# Altium footprint library ICs And Semiconductors THD.PcbLib: 507 footprints (part 21 of 32)
Each footprint in its own frame and in the unit in brackets; x right, y up, seen from the top. Pads: shape width x height; smd on the part's side, far side on the other; paste and mask are expansions set on the pad; w line width, h text height; cw(c..) or ccw(c..) is an arc to the next point about the centre after c.
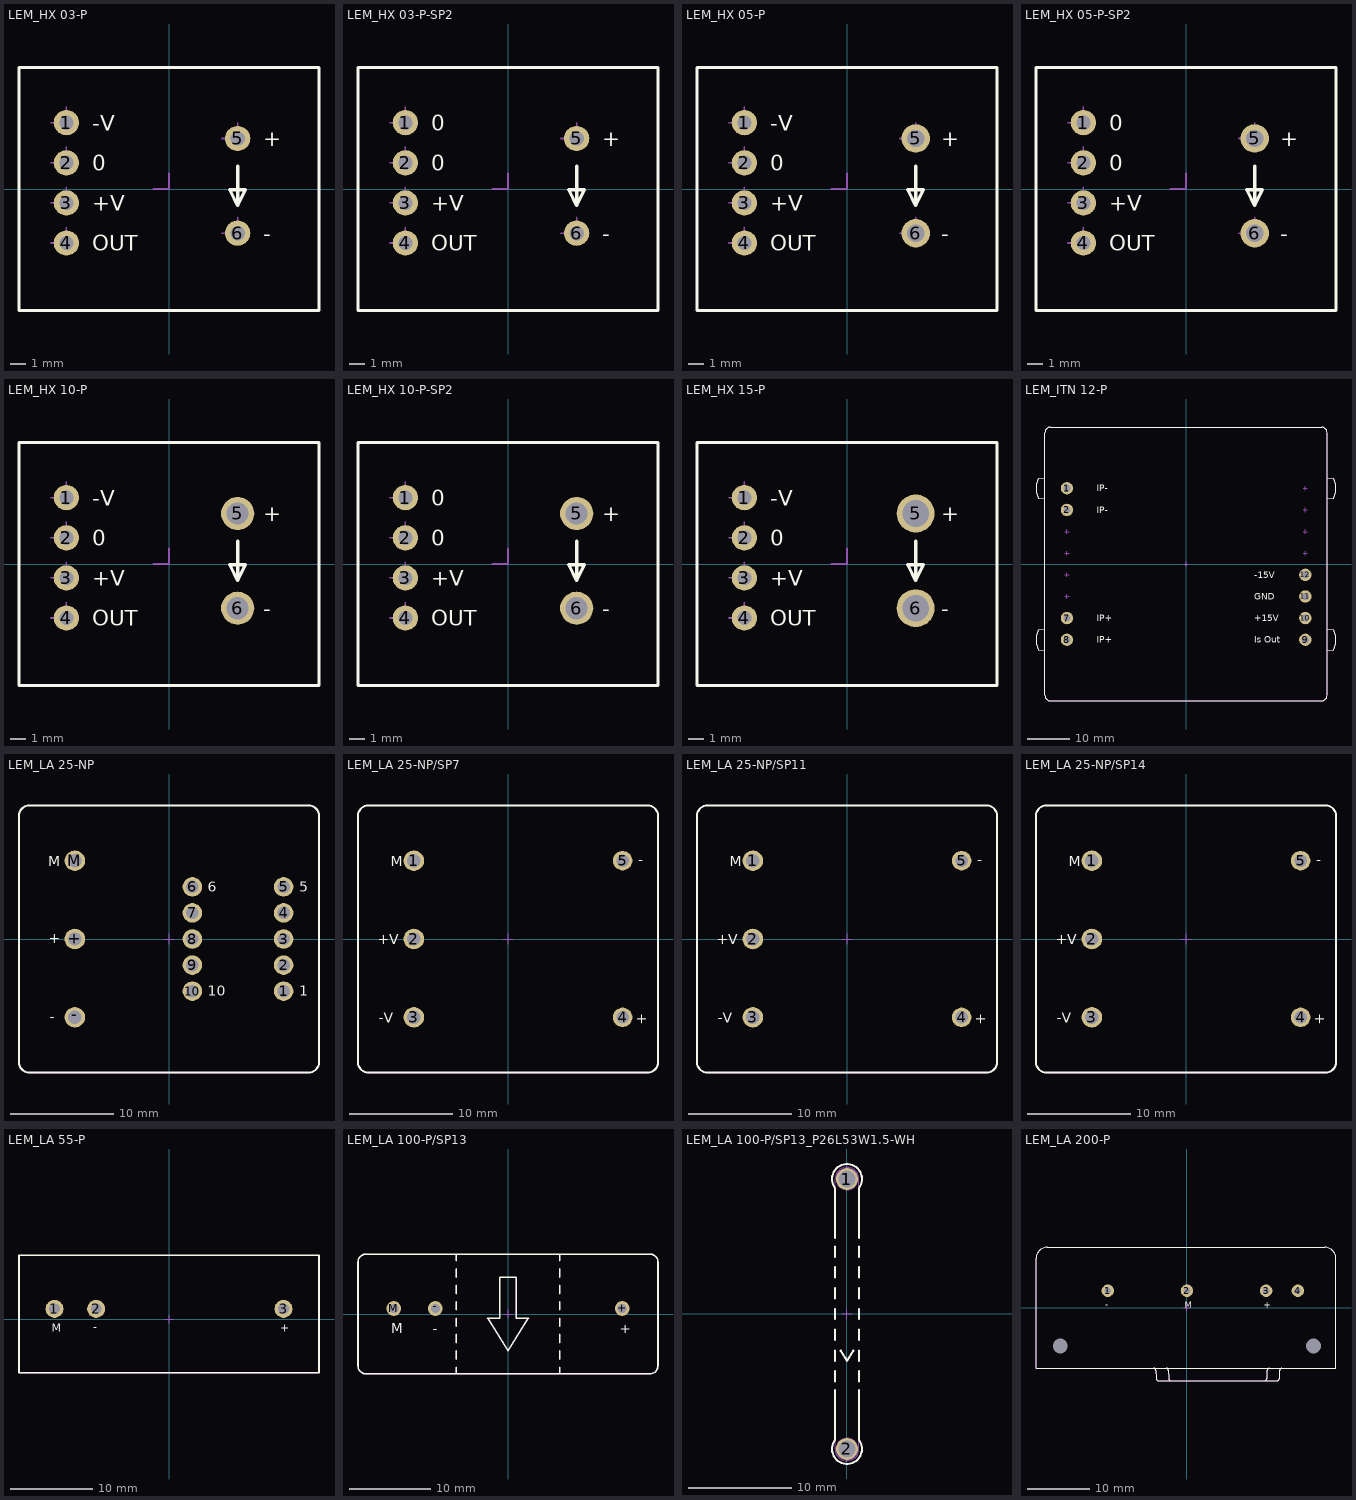
[diagram p20: the footprints below, top view; thin cyan lines are the x and y axes]

## LEM_HX 03-P [mm] "LEM Current Transducer, Body 19x15.4mm (max)"
height 20
pads (6):
  round 1.6 hole 0.9: 1(-6.5,4.2) 2(-6.5,1.66) 3(-6.5,-0.88) 4(-6.5,-3.42) 5(4.35,3.2) 6(4.35,-2.8)
Top Overlay:
  lines w0.2: 4.35,1.45 4.35,-1.05 ; 4.35,-1.05 4.85,-0.05 3.85,-0.05 4.35,-1.05 ; -9.5,-7.7 -9.5,7.7 9.5,7.7 9.5,-7.7 -9.5,-7.7
  text "-" at 5.985,-3.3 h1
  text "+" at 5.985,2.7 h1
  text "OUT" at -4.865,-3.92 h1
  text "+V" at -4.865,-1.38 h1
  text "0" at -4.865,1.16 h1
  text "-V" at -4.865,3.7 h1
Notvisible:
  circle w0.1: c4.35,-2.8 r0.3
  circle w0.1: c4.35,3.2 r0.3
  lines w0.1: -7.5,-3.42 -6.5,-3.42 -6.5,-2.42 ; -7.5,-0.88 -6.5,-0.88 -6.5,0.12 ; -7.5,1.66 -6.5,1.66 -6.5,2.66 ; -7.5,4.2 -6.5,4.2 -6.5,5.2 ; -1,0 0,0 0,1 ; 3.35,-2.8 4.35,-2.8 4.35,-1.8 ; 3.35,3.2 4.35,3.2 4.35,4.2 ; -6.625,-3.67 -6.625,-3.17 -6.375,-3.17 -6.375,-3.67 -6.625,-3.67 ; -6.625,-1.13 -6.625,-0.63 -6.375,-0.63 -6.375,-1.13 -6.625,-1.13 ; -6.625,1.41 -6.625,1.91 -6.375,1.91 -6.375,1.41 -6.625,1.41 ; -6.625,3.95 -6.625,4.45 -6.375,4.45 -6.375,3.95 -6.625,3.95
Mechanical 14:
  lines w0.1: 4.35,1.45 4.35,-1.05 ; 4.35,-1.05 3.85,-0.05 4.85,-0.05 4.35,-1.05 ; -9.5,-7.7 9.5,-7.7 9.5,7.7 -9.5,7.7 -9.5,-7.7
  text "-" at 5.985,-3.3 h1
  text "+" at 5.985,2.7 h1
  text "-V" at -4.865,3.7 h1
  text "0" at -4.865,1.16 h1
  text "+V" at -4.865,-1.38 h1
  text "OUT" at -4.865,-3.92 h1
3D body "LEM_HX 03-P.stp": height 20, standoff -4, extent -9.5,-7.7 9.5,7.7

## LEM_HX 03-P-SP2 [mm] "LEM Current Transducer, Body 19x15.4mm (max)"
height 20
pads (6):
  round 1.6 hole 0.9: 1(-6.5,4.2) 2(-6.5,1.66) 3(-6.5,-0.88) 4(-6.5,-3.42) 5(4.35,3.2) 6(4.35,-2.8)
Top Overlay:
  lines w0.2: 4.35,1.45 4.35,-1.05 ; 4.35,-1.05 3.85,-0.05 4.85,-0.05 4.35,-1.05 ; -9.5,-7.7 9.5,-7.7 9.5,7.7 -9.5,7.7 -9.5,-7.7
  text "0" at -4.865,3.7 h1
  text "0" at -4.865,1.16 h1
  text "+V" at -4.865,-1.38 h1
  text "OUT" at -4.865,-3.92 h1
  text "+" at 5.985,2.7 h1
  text "-" at 5.985,-3.3 h1
Notvisible:
  circle w0.1: c4.35,3.2 r0.3
  circle w0.1: c4.35,-2.8 r0.3
  lines w0.1: -7.5,-3.42 -6.5,-3.42 -6.5,-2.42 ; -7.5,-0.88 -6.5,-0.88 -6.5,0.12 ; -7.5,1.66 -6.5,1.66 -6.5,2.66 ; -7.5,4.2 -6.5,4.2 -6.5,5.2 ; -1,0 0,0 0,1 ; 3.35,-2.8 4.35,-2.8 4.35,-1.8 ; 3.35,3.2 4.35,3.2 4.35,4.2 ; -6.625,-3.67 -6.375,-3.67 -6.375,-3.17 -6.625,-3.17 -6.625,-3.67 ; -6.625,-1.13 -6.375,-1.13 -6.375,-0.63 -6.625,-0.63 -6.625,-1.13 ; -6.625,1.41 -6.375,1.41 -6.375,1.91 -6.625,1.91 -6.625,1.41 ; -6.625,3.95 -6.375,3.95 -6.375,4.45 -6.625,4.45 -6.625,3.95
Mechanical 14:
  lines w0.1: 4.35,1.45 4.35,-1.05 ; 4.35,-1.05 4.85,-0.05 3.85,-0.05 4.35,-1.05 ; -9.5,-7.7 -9.5,7.7 9.5,7.7 9.5,-7.7 -9.5,-7.7
  text "OUT" at -4.865,-3.92 h1
  text "+V" at -4.865,-1.38 h1
  text "0" at -4.865,1.16 h1
  text "0" at -4.865,3.7 h1
  text "+" at 5.985,2.7 h1
  text "-" at 5.985,-3.3 h1
3D body "LEM_HX 03-P-SP2.stp": height 20, standoff -4, extent -9.5,-7.7 9.5,7.7

## LEM_HX 05-P [mm] "LEM Current Transducer, Body 19x15.4mm (max)"
height 20
pads (6):
  round 1.6 hole 0.9: 1(-6.5,4.2) 2(-6.5,1.66) 3(-6.5,-0.88) 4(-6.5,-3.42)
  round 1.8 hole 1.1: 5(4.35,3.2) 6(4.35,-2.8)
Top Overlay:
  lines w0.2: 4.35,1.45 4.35,-1.05 ; 4.35,-1.05 4.85,-0.05 3.85,-0.05 4.35,-1.05 ; -9.5,-7.7 -9.5,7.7 9.5,7.7 9.5,-7.7 -9.5,-7.7
  text "-" at 5.985,-3.3 h1
  text "+" at 5.985,2.7 h1
  text "OUT" at -4.865,-3.92 h1
  text "+V" at -4.865,-1.38 h1
  text "0" at -4.865,1.16 h1
  text "-V" at -4.865,3.7 h1
Notvisible:
  circle w0.1: c4.35,-2.8 r0.3
  circle w0.1: c4.35,3.2 r0.3
  lines w0.1: -7.5,-3.42 -6.5,-3.42 -6.5,-2.42 ; -7.5,-0.88 -6.5,-0.88 -6.5,0.12 ; -7.5,1.66 -6.5,1.66 -6.5,2.66 ; -7.5,4.2 -6.5,4.2 -6.5,5.2 ; -1,0 0,0 0,1 ; 3.35,-2.8 4.35,-2.8 4.35,-1.8 ; 3.35,3.2 4.35,3.2 4.35,4.2 ; -6.625,-3.67 -6.625,-3.17 -6.375,-3.17 -6.375,-3.67 -6.625,-3.67 ; -6.625,-1.13 -6.625,-0.63 -6.375,-0.63 -6.375,-1.13 -6.625,-1.13 ; -6.625,1.41 -6.625,1.91 -6.375,1.91 -6.375,1.41 -6.625,1.41 ; -6.625,3.95 -6.625,4.45 -6.375,4.45 -6.375,3.95 -6.625,3.95
Mechanical 14:
  lines w0.1: 4.35,1.45 4.35,-1.05 ; 4.35,-1.05 3.85,-0.05 4.85,-0.05 4.35,-1.05 ; -9.5,-7.7 9.5,-7.7 9.5,7.7 -9.5,7.7 -9.5,-7.7
  text "-" at 5.985,-3.3 h1
  text "+" at 5.985,2.7 h1
  text "-V" at -4.865,3.7 h1
  text "0" at -4.865,1.16 h1
  text "+V" at -4.865,-1.38 h1
  text "OUT" at -4.865,-3.92 h1
3D body "LEM_HX 05-P.stp": height 20, standoff -4, extent -9.5,-7.7 9.5,7.7

## LEM_HX 05-P-SP2 [mm] "LEM Current Transducer, Body 19x15.4mm (max)"
height 20
pads (6):
  round 1.6 hole 0.9: 1(-6.5,4.2) 2(-6.5,1.66) 3(-6.5,-0.88) 4(-6.5,-3.42)
  round 1.8 hole 1.1: 5(4.35,3.2) 6(4.35,-2.8)
Top Overlay:
  lines w0.2: 4.35,1.45 4.35,-1.05 ; 4.35,-1.05 3.85,-0.05 4.85,-0.05 4.35,-1.05 ; -9.5,-7.7 9.5,-7.7 9.5,7.7 -9.5,7.7 -9.5,-7.7
  text "0" at -4.865,3.7 h1
  text "0" at -4.865,1.16 h1
  text "+V" at -4.865,-1.38 h1
  text "OUT" at -4.865,-3.92 h1
  text "+" at 5.985,2.7 h1
  text "-" at 5.985,-3.3 h1
Notvisible:
  circle w0.1: c4.35,3.2 r0.3
  circle w0.1: c4.35,-2.8 r0.3
  lines w0.1: -7.5,-3.42 -6.5,-3.42 -6.5,-2.42 ; -7.5,-0.88 -6.5,-0.88 -6.5,0.12 ; -7.5,1.66 -6.5,1.66 -6.5,2.66 ; -7.5,4.2 -6.5,4.2 -6.5,5.2 ; -1,0 0,0 0,1 ; 3.35,-2.8 4.35,-2.8 4.35,-1.8 ; 3.35,3.2 4.35,3.2 4.35,4.2 ; -6.625,-3.67 -6.375,-3.67 -6.375,-3.17 -6.625,-3.17 -6.625,-3.67 ; -6.625,-1.13 -6.375,-1.13 -6.375,-0.63 -6.625,-0.63 -6.625,-1.13 ; -6.625,1.41 -6.375,1.41 -6.375,1.91 -6.625,1.91 -6.625,1.41 ; -6.625,3.95 -6.375,3.95 -6.375,4.45 -6.625,4.45 -6.625,3.95
Mechanical 14:
  lines w0.1: 4.35,1.45 4.35,-1.05 ; 4.35,-1.05 4.85,-0.05 3.85,-0.05 4.35,-1.05 ; -9.5,-7.7 -9.5,7.7 9.5,7.7 9.5,-7.7 -9.5,-7.7
  text "OUT" at -4.865,-3.92 h1
  text "+V" at -4.865,-1.38 h1
  text "0" at -4.865,1.16 h1
  text "0" at -4.865,3.7 h1
  text "+" at 5.985,2.7 h1
  text "-" at 5.985,-3.3 h1
3D body "LEM_HX 05-P-SP2.stp": height 20, standoff -4, extent -9.5,-7.7 9.5,7.7

## LEM_HX 10-P [mm] "LEM Current Transducer, Body 19x15.4mm (max)"
height 20
pads (6):
  round 1.6 hole 0.9: 1(-6.5,4.2) 2(-6.5,1.66) 3(-6.5,-0.88) 4(-6.5,-3.42)
  round 2.1 hole 1.4: 5(4.35,3.2) 6(4.35,-2.8)
Top Overlay:
  lines w0.2: 4.35,1.45 4.35,-1.05 ; 4.35,-1.05 4.85,-0.05 3.85,-0.05 4.35,-1.05 ; -9.5,-7.7 -9.5,7.7 9.5,7.7 9.5,-7.7 -9.5,-7.7
  text "-" at 5.985,-3.3 h1
  text "+" at 5.985,2.7 h1
  text "OUT" at -4.865,-3.92 h1
  text "+V" at -4.865,-1.38 h1
  text "0" at -4.865,1.16 h1
  text "-V" at -4.865,3.7 h1
Notvisible:
  circle w0.1: c4.35,-2.8 r0.3
  circle w0.1: c4.35,3.2 r0.3
  lines w0.1: -7.5,-3.42 -6.5,-3.42 -6.5,-2.42 ; -7.5,-0.88 -6.5,-0.88 -6.5,0.12 ; -7.5,1.66 -6.5,1.66 -6.5,2.66 ; -7.5,4.2 -6.5,4.2 -6.5,5.2 ; -1,0 0,0 0,1 ; 3.35,-2.8 4.35,-2.8 4.35,-1.8 ; 3.35,3.2 4.35,3.2 4.35,4.2 ; -6.625,-3.67 -6.625,-3.17 -6.375,-3.17 -6.375,-3.67 -6.625,-3.67 ; -6.625,-1.13 -6.625,-0.63 -6.375,-0.63 -6.375,-1.13 -6.625,-1.13 ; -6.625,1.41 -6.625,1.91 -6.375,1.91 -6.375,1.41 -6.625,1.41 ; -6.625,3.95 -6.625,4.45 -6.375,4.45 -6.375,3.95 -6.625,3.95
Mechanical 14:
  lines w0.1: 4.35,1.45 4.35,-1.05 ; 4.35,-1.05 3.85,-0.05 4.85,-0.05 4.35,-1.05 ; -9.5,-7.7 9.5,-7.7 9.5,7.7 -9.5,7.7 -9.5,-7.7
  text "-" at 5.985,-3.3 h1
  text "+" at 5.985,2.7 h1
  text "-V" at -4.865,3.7 h1
  text "0" at -4.865,1.16 h1
  text "+V" at -4.865,-1.38 h1
  text "OUT" at -4.865,-3.92 h1
3D body "LEM_HX 10-P.stp": height 20, standoff -4, extent -9.5,-7.7 9.5,7.7

## LEM_HX 10-P-SP2 [mm] "LEM Current Transducer, Body 19x15.4mm (max)"
height 20
pads (6):
  round 1.6 hole 0.9: 1(-6.5,4.2) 2(-6.5,1.66) 3(-6.5,-0.88) 4(-6.5,-3.42)
  round 2.1 hole 1.4: 5(4.35,3.2) 6(4.35,-2.8)
Top Overlay:
  lines w0.2: 4.35,1.45 4.35,-1.05 ; 4.35,-1.05 3.85,-0.05 4.85,-0.05 4.35,-1.05 ; -9.5,-7.7 9.5,-7.7 9.5,7.7 -9.5,7.7 -9.5,-7.7
  text "0" at -4.865,3.7 h1
  text "0" at -4.865,1.16 h1
  text "+V" at -4.865,-1.38 h1
  text "OUT" at -4.865,-3.92 h1
  text "+" at 5.985,2.7 h1
  text "-" at 5.985,-3.3 h1
Notvisible:
  circle w0.1: c4.35,3.2 r0.3
  circle w0.1: c4.35,-2.8 r0.3
  lines w0.1: -7.5,-3.42 -6.5,-3.42 -6.5,-2.42 ; -7.5,-0.88 -6.5,-0.88 -6.5,0.12 ; -7.5,1.66 -6.5,1.66 -6.5,2.66 ; -7.5,4.2 -6.5,4.2 -6.5,5.2 ; -1,0 0,0 0,1 ; 3.35,-2.8 4.35,-2.8 4.35,-1.8 ; 3.35,3.2 4.35,3.2 4.35,4.2 ; -6.625,-3.67 -6.375,-3.67 -6.375,-3.17 -6.625,-3.17 -6.625,-3.67 ; -6.625,-1.13 -6.375,-1.13 -6.375,-0.63 -6.625,-0.63 -6.625,-1.13 ; -6.625,1.41 -6.375,1.41 -6.375,1.91 -6.625,1.91 -6.625,1.41 ; -6.625,3.95 -6.375,3.95 -6.375,4.45 -6.625,4.45 -6.625,3.95
Mechanical 14:
  lines w0.1: 4.35,1.45 4.35,-1.05 ; 4.35,-1.05 4.85,-0.05 3.85,-0.05 4.35,-1.05 ; -9.5,-7.7 -9.5,7.7 9.5,7.7 9.5,-7.7 -9.5,-7.7
  text "OUT" at -4.865,-3.92 h1
  text "+V" at -4.865,-1.38 h1
  text "0" at -4.865,1.16 h1
  text "0" at -4.865,3.7 h1
  text "+" at 5.985,2.7 h1
  text "-" at 5.985,-3.3 h1
3D body "LEM_HX 10-P-SP2.stp": height 20, standoff -4, extent -9.5,-7.7 9.5,7.7

## LEM_HX 15-P [mm] "LEM Current Transducer, Body 19x15.4mm (max)"
height 20
pads (6):
  round 1.6 hole 0.9: 1(-6.5,4.2) 2(-6.5,1.66) 3(-6.5,-0.88) 4(-6.5,-3.42)
  round 2.4 hole 1.7: 5(4.35,3.2) 6(4.35,-2.8)
Top Overlay:
  lines w0.2: 4.35,1.45 4.35,-1.05 ; 4.35,-1.05 4.85,-0.05 3.85,-0.05 4.35,-1.05 ; -9.5,-7.7 -9.5,7.7 9.5,7.7 9.5,-7.7 -9.5,-7.7
  text "-" at 5.985,-3.3 h1
  text "+" at 5.985,2.7 h1
  text "OUT" at -4.865,-3.92 h1
  text "+V" at -4.865,-1.38 h1
  text "0" at -4.865,1.16 h1
  text "-V" at -4.865,3.7 h1
Notvisible:
  circle w0.1: c4.35,-2.8 r0.3
  circle w0.1: c4.35,3.2 r0.3
  lines w0.1: -7.5,-3.42 -6.5,-3.42 -6.5,-2.42 ; -7.5,-0.88 -6.5,-0.88 -6.5,0.12 ; -7.5,1.66 -6.5,1.66 -6.5,2.66 ; -7.5,4.2 -6.5,4.2 -6.5,5.2 ; -1,0 0,0 0,1 ; 3.35,-2.8 4.35,-2.8 4.35,-1.8 ; 3.35,3.2 4.35,3.2 4.35,4.2 ; -6.625,-3.67 -6.625,-3.17 -6.375,-3.17 -6.375,-3.67 -6.625,-3.67 ; -6.625,-1.13 -6.625,-0.63 -6.375,-0.63 -6.375,-1.13 -6.625,-1.13 ; -6.625,1.41 -6.625,1.91 -6.375,1.91 -6.375,1.41 -6.625,1.41 ; -6.625,3.95 -6.625,4.45 -6.375,4.45 -6.375,3.95 -6.625,3.95
Mechanical 14:
  lines w0.1: 4.35,1.45 4.35,-1.05 ; 4.35,-1.05 3.85,-0.05 4.85,-0.05 4.35,-1.05 ; -9.5,-7.7 9.5,-7.7 9.5,7.7 -9.5,7.7 -9.5,-7.7
  text "-" at 5.985,-3.3 h1
  text "+" at 5.985,2.7 h1
  text "-V" at -4.865,3.7 h1
  text "0" at -4.865,1.16 h1
  text "+V" at -4.865,-1.38 h1
  text "OUT" at -4.865,-3.92 h1
3D body "LEM_HX 15-P.stp": height 20, standoff -4, extent -9.5,-7.7 9.5,7.7

## LEM_ITN 12-P [mm] "LEM Current Transducer, Body 66.2x64.2mm"
height 45.7
pads (8):
  round 2.9 hole 1.7: 1(-27.94,17.78) 2(-27.94,12.7) 7(-27.94,-12.7) 8(-27.94,-17.78) 9(28,-17.78) 10(28,-12.7) 11(28,-7.62) 12(28,-2.54)
Top Overlay:
  lines w0.2: -33.1,-20.28 -34.625,-20.147 cw(c-30.092,-17.78) -34.625,-15.413 -33.1,-15.28 ; -33.1,15.28 -34.625,15.413 cw(c-30.092,17.78) -34.625,20.147 -33.1,20.28 ; 33.1,-20.28 34.624,-20.147 ccw(c30.092,-17.78) 34.624,-15.413 33.1,-15.28 ; 33.1,15.28 34.624,15.413 ccw(c30.092,17.78) 34.624,20.147 33.1,20.28 ; -33.1,-30.83 ccw(c-31.83,-30.83) -31.83,-32.1 31.83,-32.1 ccw(c31.83,-30.83) 33.1,-30.83 33.1,30.83 ccw(c31.83,30.83) 31.83,32.1 -31.83,32.1 ccw(c-31.83,30.83) -33.1,30.83 -33.1,-30.83
  text "IP-" at -21,17.03 h1.5
  text "IP-" at -21,11.95 h1.5
  text "IP+" at -21,-13.45 h1.5
  text "IP+" at -21,-18.53 h1.5
  text "-15V" at 16,-3.29 h1.5
  text "GND" at 16,-8.37 h1.5
  text "+15V" at 16,-13.45 h1.5
  text "Is Out" at 16,-18.53 h1.5
Notvisible:
  lines w0.1: -28.44,-17.78 -27.94,-17.78 ; -28.44,-12.7 -27.94,-12.7 ; -28.44,-7.62 -27.94,-7.62 ; -28.44,-2.54 -27.94,-2.54 ; -28.44,2.54 -27.94,2.54 ; -28.44,7.62 -27.94,7.62 ; -28.44,12.7 -27.94,12.7 ; -28.44,17.78 -27.94,17.78 ; -27.94,-18.28 -27.94,-17.78 ; -27.94,-17.28 -27.94,-17.78 ; -27.94,-13.2 -27.94,-12.7 ; -27.94,-12.2 -27.94,-12.7 ; -27.94,-8.12 -27.94,-7.62 ; -27.94,-7.12 -27.94,-7.62 ; -27.94,-3.04 -27.94,-2.54 ; -27.94,-2.04 -27.94,-2.54 ; -27.94,2.04 -27.94,2.54 ; -27.94,3.04 -27.94,2.54 ; -27.94,7.12 -27.94,7.62 ; -27.94,8.12 -27.94,7.62 ; -27.94,12.2 -27.94,12.7 ; -27.94,13.2 -27.94,12.7 ; -27.94,17.28 -27.94,17.78 ; -27.94,18.28 -27.94,17.78 ; -27.44,-17.78 -27.94,-17.78 ; -27.44,-12.7 -27.94,-12.7 ; -27.44,-7.62 -27.94,-7.62 ; -27.44,-2.54 -27.94,-2.54 ; -27.44,2.54 -27.94,2.54 ; -27.44,7.62 -27.94,7.62 ; -27.44,12.7 -27.94,12.7 ; -27.44,17.78 -27.94,17.78 ; -0.5,0 0,0 ; 0,-0.5 0,0 ; 0,0.5 0,0 ; 0.5,0 0,0 ; 27.5,-17.78 28,-17.78 ; 27.5,-12.7 28,-12.7 ; 27.5,-7.62 28,-7.62 ; 27.5,-2.54 28,-2.54 ; 27.5,2.54 28,2.54 ; 27.5,7.62 28,7.62 ; 27.5,12.7 28,12.7 ; 27.5,17.78 28,17.78 ; 28,-18.28 28,-17.78 ; 28,-17.28 28,-17.78 ; 28,-13.2 28,-12.7 ; 28,-12.2 28,-12.7 ; 28,-8.12 28,-7.62 ; 28,-7.12 28,-7.62 ; 28,-3.04 28,-2.54 ; 28,-2.04 28,-2.54 ; 28,2.04 28,2.54 ; 28,3.04 28,2.54 ; 28,7.12 28,7.62 ; 28,8.12 28,7.62 ; 28,12.2 28,12.7 ; 28,13.2 28,12.7 ; 28,17.28 28,17.78 ; 28,18.28 28,17.78 ; 28.5,-17.78 28,-17.78 ; 28.5,-12.7 28,-12.7 ; 28.5,-7.62 28,-7.62 ; 28.5,-2.54 28,-2.54 ; 28.5,2.54 28,2.54 ; 28.5,7.62 28,7.62 ; 28.5,12.7 28,12.7 ; 28.5,17.78 28,17.78
Mechanical 14:
  lines w0.1: -33.1,-20.28 -34.625,-20.147 cw(c-30.092,-17.78) -34.625,-15.413 -33.1,-15.28 ; -33.1,15.28 -34.625,15.413 cw(c-30.092,17.78) -34.625,20.147 -33.1,20.28 ; 33.1,-20.28 34.624,-20.147 ccw(c30.092,-17.78) 34.624,-15.413 33.1,-15.28 ; 33.1,15.28 34.624,15.413 ccw(c30.092,17.78) 34.624,20.147 33.1,20.28 ; -33.1,-30.83 ccw(c-31.83,-30.83) -31.83,-32.1 31.83,-32.1 ccw(c31.83,-30.83) 33.1,-30.83 33.1,30.83 ccw(c31.83,30.83) 31.83,32.1 -31.83,32.1 ccw(c-31.83,30.83) -33.1,30.83 -33.1,-30.83
  text "IP-" at -21,17.03 h1.5
  text "IP-" at -21,11.95 h1.5
  text "IP+" at -21,-13.45 h1.5
  text "IP+" at -21,-18.53 h1.5
  text "-15V" at 16,-3.29 h1.5
  text "GND" at 16,-8.37 h1.5
  text "+15V" at 16,-13.45 h1.5
  text "Is Out" at 16,-18.53 h1.5
3D body "LEM_ITN 12-P.stp": height 45.7, standoff -3.5, extent -35.188,-32.1 35.188,32.1

## LEM_LA 25-NP [mm] "LEM Current Transducer, Body 29.2x26mm"
height 16.5
pads (13):
  round 1.9 hole 1.2: 1(11.16,-5.08) 2(11.16,-2.54) 3(11.16,0) 4(11.16,2.54) 5(11.16,5.08) 6(2.27,5.08) 7(2.27,2.54) 8(2.27,0) 9(2.27,-2.54) 10(2.27,-5.08)
  round 2 hole 1.3: +(-9.16,0) -(-9.16,-7.62) M(-9.16,7.62)
Top Overlay:
  lines w0.2: -14.6,-12 ccw(c-13.6,-12) -13.6,-13 13.6,-13 ccw(c13.6,-12) 14.6,-12 14.6,12 ccw(c13.6,12) 13.6,13 -13.6,13 ccw(c-13.6,12) -14.6,12 -14.6,-12
  text "+" at -11.7,-0.425 h1
  text "M" at -11.73,7.104 h1
  text "-" at -11.589,-8.061 h1
  text "5" at 12.684,4.616 h1
  text "1" at 12.684,-5.539 h1
  text "6" at 3.794,4.616 h1
  text "10" at 3.794,-5.544 h1
Notvisible:
  lines w0.1: -9.66,-7.62 -9.16,-7.62 ; -9.66,0 -9.16,0 ; -9.66,7.62 -9.16,7.62 ; -9.16,-8.12 -9.16,-7.62 ; -9.16,-7.12 -9.16,-7.62 ; -9.16,-0.5 -9.16,0 ; -9.16,0.5 -9.16,0 ; -9.16,7.12 -9.16,7.62 ; -9.16,8.12 -9.16,7.62 ; -8.66,-7.62 -9.16,-7.62 ; -8.66,0 -9.16,0 ; -8.66,7.62 -9.16,7.62 ; -0.5,0 0,0 ; 0,-0.5 0,0 ; 0,0.5 0,0 ; 0.5,0 0,0 ; 1.77,-5.08 2.27,-5.08 ; 1.77,-2.54 2.27,-2.54 ; 1.77,0 2.27,0 ; 1.77,2.54 2.27,2.54 ; 1.77,5.08 2.27,5.08 ; 2.27,-5.58 2.27,-5.08 ; 2.27,-4.58 2.27,-5.08 ; 2.27,-3.04 2.27,-2.54 ; 2.27,-2.04 2.27,-2.54 ; 2.27,-0.5 2.27,0 ; 2.27,0.5 2.27,0 ; 2.27,2.04 2.27,2.54 ; 2.27,3.04 2.27,2.54 ; 2.27,4.58 2.27,5.08 ; 2.27,5.58 2.27,5.08 ; 2.77,-5.08 2.27,-5.08 ; 2.77,-2.54 2.27,-2.54 ; 2.77,0 2.27,0 ; 2.77,2.54 2.27,2.54 ; 2.77,5.08 2.27,5.08 ; 10.66,-5.08 11.16,-5.08 ; 10.66,-2.54 11.16,-2.54 ; 10.66,0 11.16,0 ; 10.66,2.54 11.16,2.54 ; 10.66,5.08 11.16,5.08 ; 11.16,-5.58 11.16,-5.08 ; 11.16,-4.58 11.16,-5.08 ; 11.16,-3.04 11.16,-2.54 ; 11.16,-2.04 11.16,-2.54 ; 11.16,-0.5 11.16,0 ; 11.16,0.5 11.16,0 ; 11.16,2.04 11.16,2.54 ; 11.16,3.04 11.16,2.54 ; 11.16,4.58 11.16,5.08 ; 11.16,5.58 11.16,5.08 ; 11.66,-5.08 11.16,-5.08 ; 11.66,-2.54 11.16,-2.54 ; 11.66,0 11.16,0 ; 11.66,2.54 11.16,2.54 ; 11.66,5.08 11.16,5.08
Mechanical 14:
  lines w0.1: -14.6,-12 ccw(c-13.6,-12) -13.6,-13 13.6,-13 ccw(c13.6,-12) 14.6,-12 14.6,12 ccw(c13.6,12) 13.6,13 -13.6,13 ccw(c-13.6,12) -14.6,12 -14.6,-12
  text "-" at -11.589,-8.061 h1
  text "M" at -11.73,7.104 h1
  text "+" at -11.7,-0.425 h1
  text "5" at 12.684,4.616 h1
  text "1" at 12.684,-5.539 h1
  text "6" at 3.794,4.616 h1
  text "10" at 3.794,-5.544 h1
3D body "LEM_LA 25-NP.stp": height 16.5, standoff -3.8, extent -14.6,-13 14.6,13

## LEM_LA 25-NP/SP7 [mm] "LEM Current Transducer, Body 29.2x26mm"
height 16.5
pads (5):
  round 2 hole 1.3: 1(-9.16,7.62) 2(-9.16,0) 3(-9.16,-7.62)
  round 1.9 hole 1.2: 4(11.16,-7.62) 5(11.16,7.62)
Top Overlay:
  lines w0.2: -14.6,-12 ccw(c-13.6,-12) -13.6,-13 13.6,-13 ccw(c13.6,-12) 14.6,-12 14.6,12 ccw(c13.6,12) 13.6,13 -13.6,13 ccw(c-13.6,12) -14.6,12 -14.6,-12
  text "-V" at -12.589,-8.136 h1
  text "M" at -11.43,7.104 h1
  text "+V" at -12.7,-0.5 h1
  text "+" at 12.565,-7.223 h1
  text "-" at 12.684,7.231 h1
Notvisible:
  lines w0.1: -9.66,-7.62 -9.16,-7.62 ; -9.66,0 -9.16,0 ; -9.66,7.62 -9.16,7.62 ; -9.16,-8.12 -9.16,-7.62 ; -9.16,-7.12 -9.16,-7.62 ; -9.16,-0.5 -9.16,0 ; -9.16,0.5 -9.16,0 ; -9.16,7.12 -9.16,7.62 ; -9.16,8.12 -9.16,7.62 ; -8.66,-7.62 -9.16,-7.62 ; -8.66,0 -9.16,0 ; -8.66,7.62 -9.16,7.62 ; -0.5,0 0,0 ; 0,-0.5 0,0 ; 0,0.5 0,0 ; 0.5,0 0,0 ; 10.66,-7.62 11.16,-7.62 ; 10.66,7.62 11.16,7.62 ; 11.16,-8.12 11.16,-7.62 ; 11.16,-7.12 11.16,-7.62 ; 11.16,7.12 11.16,7.62 ; 11.16,8.12 11.16,7.62 ; 11.66,-7.62 11.16,-7.62 ; 11.66,7.62 11.16,7.62
Mechanical 14:
  lines w0.1: -14.6,-12 ccw(c-13.6,-12) -13.6,-13 13.6,-13 ccw(c13.6,-12) 14.6,-12 14.6,12 ccw(c13.6,12) 13.6,13 -13.6,13 ccw(c-13.6,12) -14.6,12 -14.6,-12
  text "+V" at -12.7,-0.5 h1
  text "M" at -11.43,7.104 h1
  text "-V" at -12.589,-8.136 h1
  text "+" at 12.565,-7.223 h1
  text "-" at 12.684,7.231 h1
3D body "LEM_LA 25-NP-SP7.stp": height 16.45, standoff -3, extent -14.6,-13 14.6,13

## LEM_LA 25-NP/SP11 [mm] "LEM Current Transducer, Body 29.2x26mm"
height 16.55
pads (5):
  round 2 hole 1.3: 1(-9.16,7.62) 2(-9.16,0) 3(-9.16,-7.62)
  round 1.9 hole 1.2: 4(11.16,-7.62) 5(11.16,7.62)
Top Overlay:
  lines w0.2: -14.6,-12 ccw(c-13.6,-12) -13.6,-13 13.6,-13 ccw(c13.6,-12) 14.6,-12 14.6,12 ccw(c13.6,12) 13.6,13 -13.6,13 ccw(c-13.6,12) -14.6,12 -14.6,-12
  text "-" at 12.684,7.231 h1
  text "+" at 12.565,-7.223 h1
  text "+V" at -12.7,-0.5 h1
  text "M" at -11.43,7.104 h1
  text "-V" at -12.589,-8.136 h1
Notvisible:
  lines w0.1: -9.66,-7.62 -9.16,-7.62 ; -9.66,0 -9.16,0 ; -9.66,7.62 -9.16,7.62 ; -9.16,-8.12 -9.16,-7.62 ; -9.16,-7.12 -9.16,-7.62 ; -9.16,-0.5 -9.16,0 ; -9.16,0.5 -9.16,0 ; -9.16,7.12 -9.16,7.62 ; -9.16,8.12 -9.16,7.62 ; -8.66,-7.62 -9.16,-7.62 ; -8.66,0 -9.16,0 ; -8.66,7.62 -9.16,7.62 ; -0.5,0 0,0 ; 0,-0.5 0,0 ; 0,0.5 0,0 ; 0.5,0 0,0 ; 10.66,-7.62 11.16,-7.62 ; 10.66,7.62 11.16,7.62 ; 11.16,-8.12 11.16,-7.62 ; 11.16,-7.12 11.16,-7.62 ; 11.16,7.12 11.16,7.62 ; 11.16,8.12 11.16,7.62 ; 11.66,-7.62 11.16,-7.62 ; 11.66,7.62 11.16,7.62
Mechanical 14:
  lines w0.1: -14.6,-12 ccw(c-13.6,-12) -13.6,-13 13.6,-13 ccw(c13.6,-12) 14.6,-12 14.6,12 ccw(c13.6,12) 13.6,13 -13.6,13 ccw(c-13.6,12) -14.6,12 -14.6,-12
  text "-" at 12.684,7.231 h1
  text "+" at 12.565,-7.223 h1
  text "-V" at -12.589,-8.136 h1
  text "M" at -11.43,7.104 h1
  text "+V" at -12.7,-0.5 h1
3D body "LEM_LA 25-NP-SP11.stp": height 16.45, standoff -3, extent -14.6,-13 14.6,13

## LEM_LA 25-NP/SP14 [mm] "LEM Current Transducer, Body 29.2x26mm"
height 16.45
pads (5):
  round 2 hole 1.3: 1(-9.16,7.62) 2(-9.16,0) 3(-9.16,-7.62)
  round 1.9 hole 1.2: 4(11.16,-7.62) 5(11.16,7.62)
Top Overlay:
  lines w0.2: -14.6,-12 ccw(c-13.6,-12) -13.6,-13 13.6,-13 ccw(c13.6,-12) 14.6,-12 14.6,12 ccw(c13.6,12) 13.6,13 -13.6,13 ccw(c-13.6,12) -14.6,12 -14.6,-12
  text "-" at 12.684,7.231 h1
  text "+" at 12.565,-7.223 h1
  text "+V" at -12.7,-0.5 h1
  text "M" at -11.43,7.104 h1
  text "-V" at -12.589,-8.136 h1
Notvisible:
  lines w0.1: -9.66,-7.62 -9.16,-7.62 ; -9.66,0 -9.16,0 ; -9.66,7.62 -9.16,7.62 ; -9.16,-8.12 -9.16,-7.62 ; -9.16,-7.12 -9.16,-7.62 ; -9.16,-0.5 -9.16,0 ; -9.16,0.5 -9.16,0 ; -9.16,7.12 -9.16,7.62 ; -9.16,8.12 -9.16,7.62 ; -8.66,-7.62 -9.16,-7.62 ; -8.66,0 -9.16,0 ; -8.66,7.62 -9.16,7.62 ; -0.5,0 0,0 ; 0,-0.5 0,0 ; 0,0.5 0,0 ; 0.5,0 0,0 ; 10.66,-7.62 11.16,-7.62 ; 10.66,7.62 11.16,7.62 ; 11.16,-8.12 11.16,-7.62 ; 11.16,-7.12 11.16,-7.62 ; 11.16,7.12 11.16,7.62 ; 11.16,8.12 11.16,7.62 ; 11.66,-7.62 11.16,-7.62 ; 11.66,7.62 11.16,7.62
Mechanical 14:
  lines w0.1: -14.6,-12 ccw(c-13.6,-12) -13.6,-13 13.6,-13 ccw(c13.6,-12) 14.6,-12 14.6,12 ccw(c13.6,12) 13.6,13 -13.6,13 ccw(c-13.6,12) -14.6,12 -14.6,-12
  text "-" at 12.684,7.231 h1
  text "+" at 12.565,-7.223 h1
  text "-V" at -12.589,-8.136 h1
  text "M" at -11.43,7.104 h1
  text "+V" at -12.7,-0.5 h1
3D body "LEM_LA 25-NP-SP14.stp": height 16.45, standoff -3, extent -14.6,-13 14.6,13

## LEM_LA 55-P [mm] "LEM Current Transducer, Body 36.6x14.4mm"
height 27.6
pads (3):
  round 2.2 hole 1.3: 1(-13.97,1.25) 2(-8.89,1.25) 3(13.97,1.25)
Top Overlay:
  lines w0.2: -18.3,-6.55 -18.3,7.8 18.3,7.8 18.3,-6.55 -18.3,-6.55
  text "-" at -9.27,-1.445 h1
  text "+" at 13.56,-1.545 h1
  text "M" at -14.31,-1.516 h1
Notvisible:
  lines w0.05: -14.47,1.25 -13.97,1.25 ; -13.97,0.75 -13.97,1.25 ; -13.97,1.75 -13.97,1.25 ; -13.47,1.25 -13.97,1.25 ; -9.39,1.25 -8.89,1.25 ; -8.89,0.75 -8.89,1.25 ; -8.89,1.75 -8.89,1.25 ; -8.39,1.25 -8.89,1.25 ; -0.5,0 0,0 ; 0,-0.5 0,0 ; 0,0.5 0,0 ; 0.5,0 0,0 ; 13.47,1.25 13.97,1.25 ; 13.97,0.75 13.97,1.25 ; 13.97,1.75 13.97,1.25 ; 14.47,1.25 13.97,1.25
Mechanical 14:
  lines w0.1: -18.3,-6.55 -18.3,7.8 18.3,7.8 18.3,-6.55 -18.3,-6.55
  text "-" at -9.27,-1.445 h1
  text "M" at -14.31,-1.516 h1
  text "+" at 13.56,-1.545 h1
3D body "LEM_LA 55-P.stp": height 27.6, standoff -4.5, extent -18.3,-6.55 18.3,7.8

## LEM_LA 100-P/SP13 [mm] "LEM Current Transducer, Body 36.5X14.45"
height 27.8
pads (3):
  round 1.8 hole 1.1: +(13.97,0.675) -(-8.89,0.675) M(-13.97,0.675)
Top Overlay:
  lines w0.2: -6.35,-7.325 -6.35,-6.5 ; -6.35,-5.5 -6.35,-4.5 ; -6.35,-3.5 -6.35,-2.5 ; -6.35,-1.5 -6.35,-0.5 ; -6.35,0.5 -6.35,1.5 ; -6.35,2.5 -6.35,3.5 ; -6.35,4.5 -6.35,5.5 ; -6.35,6.5 -6.35,7.325 ; 6.35,-7.325 6.35,-6.5 ; 6.35,-5.5 6.35,-4.5 ; 6.35,-3.5 6.35,-2.5 ; 6.35,-1.5 6.35,-0.5 ; 6.35,0.5 6.35,1.5 ; 6.35,2.5 6.35,3.5 ; 6.35,4.5 6.35,5.5 ; 6.35,6.5 6.35,7.325 ; -18.35,-6.325 ccw(c-17.35,-6.325) -17.35,-7.325 17.35,-7.325 ccw(c17.35,-6.325) 18.35,-6.325 18.35,6.325 ccw(c17.35,6.325) 17.35,7.325 -17.35,7.325 ccw(c-17.35,6.325) -18.35,6.325 -18.35,-6.325 ; -2.5,-0.5 -1,-0.5 -1,4.5 1,4.5 1,-0.5 2.5,-0.5 0,-4.5 -2.5,-0.5
  text "M" at -14.303,-2.365 h1.2
  text "-" at -9.213,-2.365 h1.2
  text "+" at 13.647,-2.365 h1.2
Notvisible:
  lines w0.1: -14.47,0.675 -13.97,0.675 ; -13.97,0.175 -13.97,0.675 ; -13.97,1.175 -13.97,0.675 ; -13.47,0.675 -13.97,0.675 ; -9.39,0.675 -8.89,0.675 ; -8.89,0.175 -8.89,0.675 ; -8.89,1.175 -8.89,0.675 ; -8.39,0.675 -8.89,0.675 ; -0.5,0 0,0 ; 0,-0.5 0,0 ; 0,0.5 0,0 ; 0.5,0 0,0 ; 13.47,0.675 13.97,0.675 ; 13.97,0.175 13.97,0.675 ; 13.97,1.175 13.97,0.675 ; 14.47,0.675 13.97,0.675
Mechanical 14:
  lines w0.1: -6.35,-7.325 -6.35,-6.5 ; -6.35,-5.5 -6.35,-4.5 ; -6.35,-3.5 -6.35,-2.5 ; -6.35,-1.5 -6.35,-0.5 ; -6.35,0.5 -6.35,1.5 ; -6.35,2.5 -6.35,3.5 ; -6.35,4.5 -6.35,5.5 ; -6.35,6.5 -6.35,7.325 ; 6.35,-7.325 6.35,-6.5 ; 6.35,-5.5 6.35,-4.5 ; 6.35,-3.5 6.35,-2.5 ; 6.35,-1.5 6.35,-0.5 ; 6.35,0.5 6.35,1.5 ; 6.35,2.5 6.35,3.5 ; 6.35,4.5 6.35,5.5 ; 6.35,6.5 6.35,7.325 ; -18.35,-6.325 ccw(c-17.35,-6.325) -17.35,-7.325 17.35,-7.325 ccw(c17.35,-6.325) 18.35,-6.325 18.35,6.325 ccw(c17.35,6.325) 17.35,7.325 -17.35,7.325 ccw(c-17.35,6.325) -18.35,6.325 -18.35,-6.325 ; -2.5,-0.5 -1,-0.5 -1,4.5 1,4.5 1,-0.5 2.5,-0.5 0,-4.5 -2.5,-0.5
  text "M" at -14.303,-2.365 h1.2
  text "-" at -9.213,-2.365 h1.2
  text "+" at 13.647,-2.365 h1.2
3D body "LEM_LA 100-P-SP13.stp": height 27.8, standoff -3.6, extent -18.35,-7.325 18.35,7.325

## LEM_LA 100-P/SP13_P26L53W1.5-WH [mm] "Electronic Flexible Wire, Pitch 26mm, Length 53mm, Section1.5mm², Insulation ø2.3mm for LEM LA 100-P/SP13 Current Transducer"
height 13
pads (2):
  round 2.1 hole 1.6: 1(0,13) 2(0,-13)
Top Overlay:
  lines w0.2: -1.15,-7.325 -1.15,-12.117 ccw(c0,-13) 1.15,-12.117 1.15,-7.325 ; -1.15,-6.5 -1.15,-5.5 ; -1.15,-4.5 -1.15,-3.5 ; -1.15,-2.5 -1.15,-1.5 ; -1.15,-0.5 -1.15,0.5 ; -1.15,1.5 -1.15,2.5 ; -1.15,3.5 -1.15,4.5 ; -1.15,5.5 -1.15,6.5 ; -1.15,7.325 -1.15,12.117 cw(c0,13) 1.15,12.117 1.15,7.325 ; -0.601,-3.538 0,-4.5 0.601,-3.538 ; 1.15,-6.5 1.15,-5.5 ; 1.15,-4.5 1.15,-3.5 ; 1.15,-2.5 1.15,-1.5 ; 1.15,-0.5 1.15,0.5 ; 1.15,1.5 1.15,2.5 ; 1.15,3.5 1.15,4.5 ; 1.15,5.5 1.15,6.5
Notvisible:
  circle w0.1: c0,13 r1.05
  circle w0.1: c0,13 r0.8
  circle w0.1: c0,-13 r1.05
  circle w0.1: c0,-13 r0.8
  circle w0.1: c0,13 r0.8
  lines w0.1: -0.5,-13 0,-13 ; -0.5,0 0,0 ; -0.5,13 0,13 ; 0,-13.5 0,-13 ; 0,-12.5 0,-13 ; 0,-0.5 0,0 ; 0,0.5 0,0 ; 0,12.5 0,13 ; 0,13.5 0,13 ; 0.5,-13 0,-13 ; 0.5,0 0,0 ; 0.5,13 0,13
Mechanical 14:
  lines w0.1: -1.15,-13 -1.15,-7.325 ; -1.15,-6.5 -1.15,-5.5 ; -1.15,-4.5 -1.15,-3.5 ; -1.15,-2.5 -1.15,-1.5 ; -1.15,-0.5 -1.15,0.5 ; -1.15,1.5 -1.15,2.5 ; -1.15,3.5 -1.15,4.5 ; -1.15,5.5 -1.15,6.5 ; -1.15,7.325 -1.15,13 cw(c0,13) 1.15,13 1.15,7.325 ; -1.146,-12.898 ccw(c0,-13) 1.15,-13 1.15,-7.325 ; 1.15,-6.5 1.15,-5.5 ; 1.15,-4.5 1.15,-3.5 ; 1.15,-2.5 1.15,-1.5 ; 1.15,-0.5 1.15,0.5 ; 1.15,1.5 1.15,2.5 ; 1.15,3.5 1.15,4.5 ; 1.15,5.5 1.15,6.5 ; 1.15,9.675 1.15,10.675
3D body "LEM_LA 100-P-SP13_P26L53W1.5-WH.stp": height 12.95, standoff -3.9, extent -1.15,-14.148 1.141,14.148

## LEM_LA 200-P [mm] "LEM Current Transducer, Body 48.4x21.4mm"
height 33.6
pads (6):
  round 2 hole 1.1: 1(-12.7,2.75) 2(0,2.75) 3(12.7,2.75) 4(17.78,2.75)
  round 0.5 hole 2.4 unplated mask+0.95: H1(-20.32,-6.14) H2(20.32,-6.14)
Top Overlay:
  lines w0.2: -5.318,-9.68 cw(c-5.318,-10.03) -4.968,-10.027 -4.958,-11.234 ccw(c-4.508,-11.23) -4.508,-11.68 14.4,-11.68 ccw(c14.4,-11.23) 14.85,-11.234 14.861,-10.027 cw(c15.211,-10.03) 15.211,-9.68 ; -3.318,-9.68 cw(c-3.318,-10.03) -2.968,-10.027 -2.958,-11.234 ccw(c-2.508,-11.23) -2.508,-11.68 ; 12.4,-11.68 ccw(c12.4,-11.23) 12.85,-11.234 12.861,-10.027 cw(c13.211,-10.03) 13.211,-9.68 ; -24.21,-9.68 -24.21,7.936 cw(c-22.411,7.92) -22.411,9.72 22.103,9.72 cw(c22.103,7.92) 23.903,7.936 23.903,-9.68 -24.21,-9.68
  text "-" at -13.08,0.055 h1
  text "+" at 12.29,-0.045 h1
  text "M" at -0.34,-0.016 h1
Notvisible:
  lines w0.05: -20.82,-6.14 -20.32,-6.14 ; -20.32,-6.64 -20.32,-6.14 ; -20.32,-5.64 -20.32,-6.14 ; -19.82,-6.14 -20.32,-6.14 ; -13.2,2.75 -12.7,2.75 ; -12.7,2.25 -12.7,2.75 ; -12.7,3.25 -12.7,2.75 ; -12.2,2.75 -12.7,2.75 ; -0.5,0 0,0 ; -0.5,2.75 0,2.75 ; 0,-0.5 0,0 ; 0,0.5 0,0 ; 0,2.25 0,2.75 ; 0,3.25 0,2.75 ; 0.5,0 0,0 ; 0.5,2.75 0,2.75 ; 12.2,2.75 12.7,2.75 ; 12.7,2.25 12.7,2.75 ; 12.7,3.25 12.7,2.75 ; 13.2,2.75 12.7,2.75 ; 17.28,2.75 17.78,2.75 ; 17.78,2.25 17.78,2.75 ; 17.78,3.25 17.78,2.75 ; 18.28,2.75 17.78,2.75 ; 19.82,-6.14 20.32,-6.14 ; 20.32,-6.64 20.32,-6.14 ; 20.32,-5.64 20.32,-6.14 ; 20.82,-6.14 20.32,-6.14
Mechanical 14:
  lines w0.1: -5.318,-9.68 cw(c-5.318,-10.03) -4.968,-10.027 -4.958,-11.234 ccw(c-4.508,-11.23) -4.508,-11.68 14.4,-11.68 ccw(c14.4,-11.23) 14.85,-11.234 14.861,-10.027 cw(c15.211,-10.03) 15.211,-9.68 ; -3.318,-9.68 cw(c-3.318,-10.03) -2.968,-10.027 -2.958,-11.234 ccw(c-2.508,-11.23) -2.508,-11.68 ; 12.4,-11.68 ccw(c12.4,-11.23) 12.85,-11.234 12.861,-10.027 cw(c13.211,-10.03) 13.211,-9.68 ; -24.21,-9.68 -24.21,7.936 cw(c-22.411,7.92) -22.411,9.72 22.103,9.72 cw(c22.103,7.92) 23.903,7.936 23.903,-9.68 -24.21,-9.68
  text "-" at -13.08,0.055 h1
  text "M" at -0.34,-0.016 h1
  text "+" at 12.29,-0.045 h1
3D body "LEM_LA 200-P.stp": height 33.6, standoff -5, extent -24.21,-11.7 24.21,9.7